# Altium footprint library 7.Connectors&Battary_holders.PcbLib: 133 footprints (part 1 of 9)
Each footprint in its own frame and in the unit in brackets; x right, y up, seen from the top. Pads: shape width x height; smd on the part's side, far side on the other; paste and mask are expansions set on the pad; w line width, h text height; cw(c..) or ccw(c..) is an arc to the next point about the centre after c.
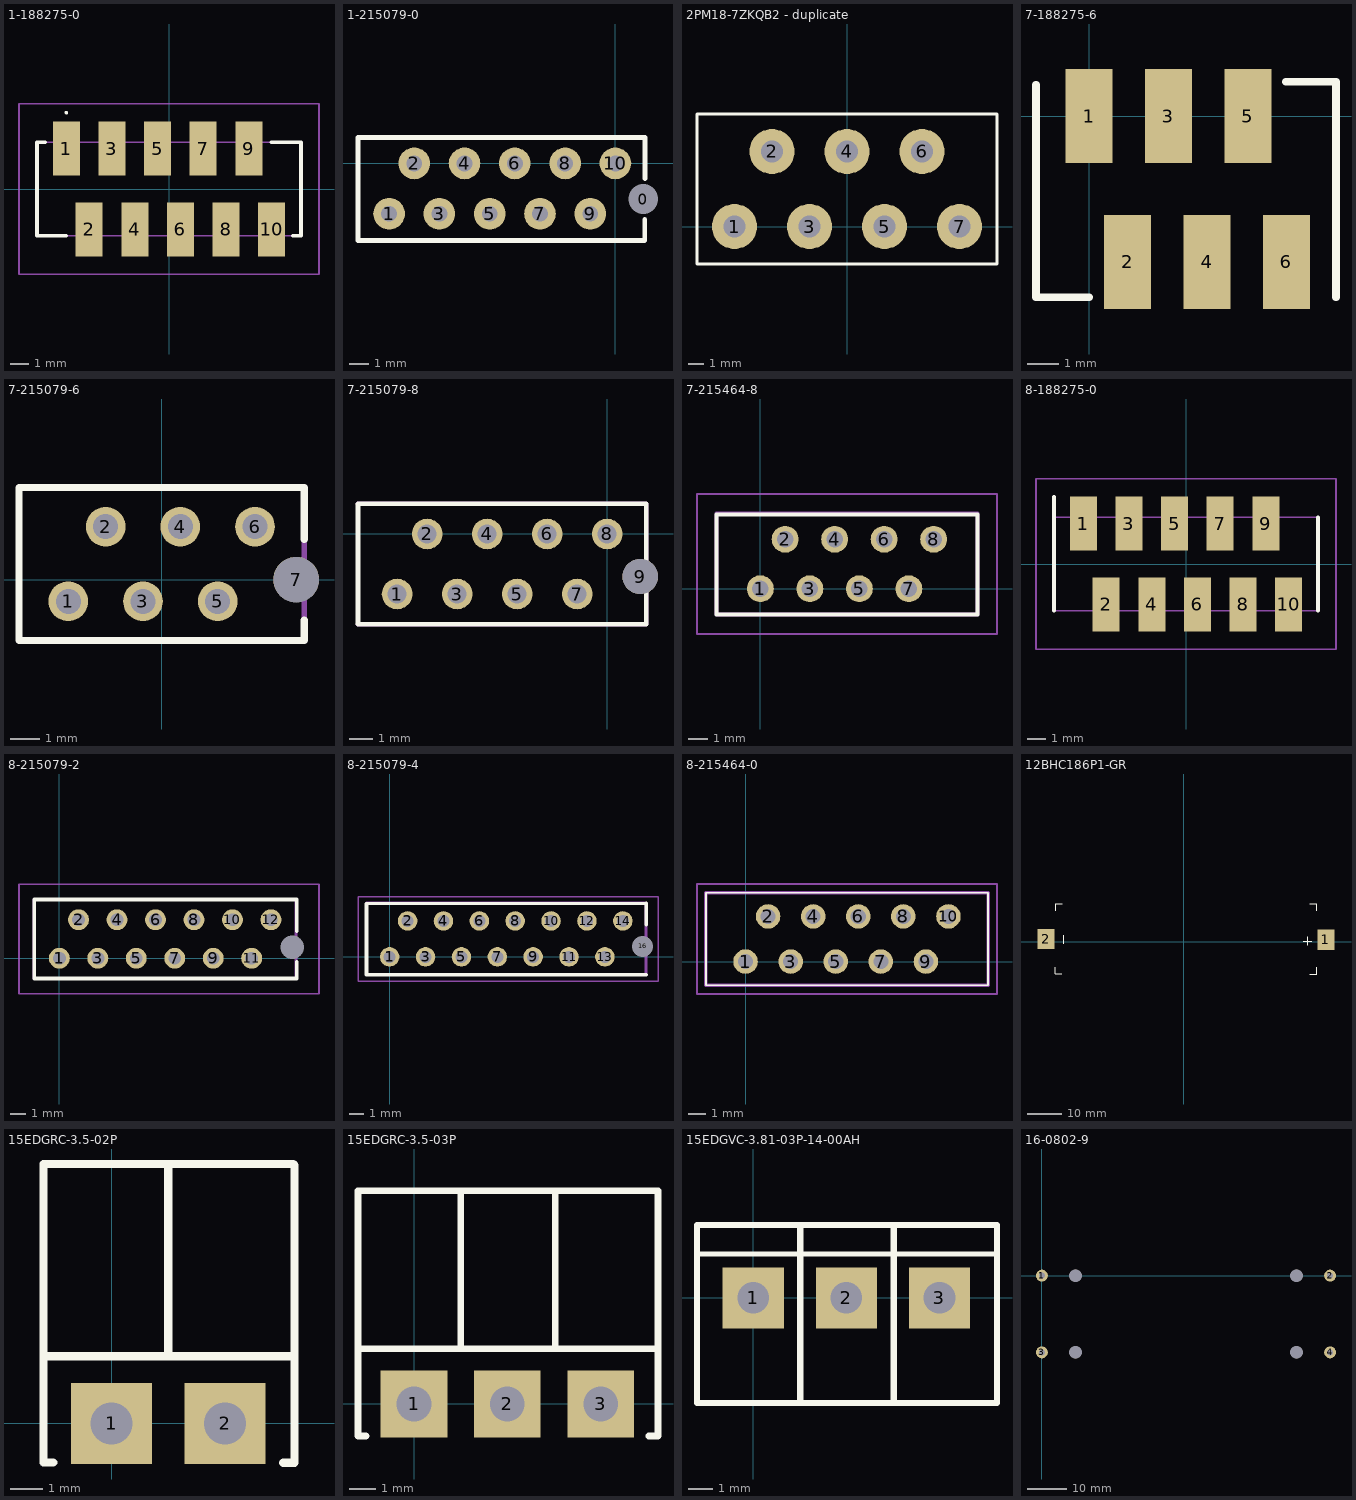
[diagram p0: the footprints below, top view; thin cyan lines are the x and y axes]

## 1-188275-0 [mm]
pads (10):
  rect 1.5x3 smd: 1(-5.715,2.25) 2(-4.445,-2.25) 3(-3.175,2.25) 4(-1.905,-2.25) 5(-0.635,2.25) 6(0.635,-2.25) 7(1.905,2.25) 8(3.175,-2.25) 9(4.445,2.25) 10(5.715,-2.25)
Top Overlay:
  lines w0.1: -5.715,4.2 ccw(c-5.715,4.25) -5.715,4.3 ccw(c-5.715,4.25) -5.715,4.2
  lines w0.2: -6.9,2.6 -7.35,2.6 -7.35,-2.6 -5.715,-2.6 ; 5.7,2.6 7.35,2.6 7.35,-2.6 6.9,-2.6
Mechanical 13:
  lines w0.1: -7.35,-2.6 7.35,-2.6 7.35,2.6 -7.35,2.6 -7.35,-2.6
Mechanical 15:
  lines w0.1: -8.35,-4.75 8.35,-4.75 8.35,4.75 -8.35,4.75 -8.35,-4.75
3D body "1-188275-0.stp": height 5.25, standoff 0, extent -7.315,-3.45 7.315,3.45

## 1-215079-0 [mm]
pads (11):
  round 1 hole 1.5: 0(1.4,-1.8)
  round 1.6 hole 0.8: 1(-11.43,-2.54) 2(-10.16,0) 3(-8.89,-2.54) 4(-7.62,0) 5(-6.35,-2.54) 6(-5.08,0) 7(-3.81,-2.54) 8(-2.54,0) 9(-1.27,-2.54) 10(0,0)
Top Overlay:
  lines w0.25: 1.439,1.309 -13,1.309 -13,-3.891 1.482,-3.891 1.482,-2.818 ; 1.485,-0.761 1.485,1.309
3D body "1-215079-0.stp": height 4, standoff -3.15, extent -13.1,-3.8 1.51,1.2

## 2PM18-7ZKQB2 - duplicate [mm]
pads (7):
  round 3 hole 1.5: 1(-7.5,0) 2(-5,5) 3(-2.5,0) 4(0,5) 5(2.5,0) 6(5,5) 7(7.5,0)
Top Overlay:
  lines w0.2: -10,-2.5 10,-2.5 10,7.5 -10,7.5 -10,-2.5

## 7-188275-6 [mm]
pads (6):
  rect 1.5x3 smd: 1(0,0) 2(1.232,-4.667) 3(2.54,0) 4(3.772,-4.667) 5(5.08,0) 6(6.312,-4.667)
Top Overlay:
  lines w0.25: -1.7,1 -1.7,-5.8 0,-5.8 ; 6.3,1.1 7.9,1.1 7.9,-5.8
3D body "7-188275-6.stp": height 5.3, standoff 0.05, extent -1.639,-5.841 7.911,1.059

## 7-215079-6 [mm]
pads (7):
  round 1.35 hole 0.85: 1(-3.175,-0.74) 2(-1.905,1.8) 3(-0.635,-0.74) 4(0.635,1.8) 5(1.905,-0.74) 6(3.175,1.8)
  round 1.55 hole 1.55: 7(4.575,0)
Top Overlay:
  lines w0.25: 4.85,-1.377 4.85,-2.07 -4.85,-2.07 -4.85,3.13 4.85,3.13 4.85,1.377
Mechanical 13:
  lines w0.2: -4.85,-2.07 4.85,-2.07 4.85,3.13 -4.85,3.13 -4.85,-2.07
3D body "7-215079-6.stp": height 3.96, standoff -3.19, extent -4.78,-1.97 4.78,3.03

## 7-215079-8 [mm] "XS?"
pads (9):
  round 1.3 hole 0.8: 1(-8.89,-2.54) 2(-7.62,0) 3(-6.35,-2.54) 4(-5.08,0) 5(-3.81,-2.54) 6(-2.54,0) 7(-1.27,-2.54) 8(0,0)
  round 1.5 hole 1.5 unplated: 9(1.4,-1.8)
Top Overlay:
  lines w0.2: -10.545,-3.82 1.655,-3.82 1.655,1.28 -10.545,1.28 ; -10.545,-3.82 -10.545,1.28 ; -10.545,-3.82 -10.545,1.28
Mechanical 13:
  lines w0.2: -10.545,-3.82 1.655,-3.82 1.655,1.28 -10.545,1.28
3D body "7-215079-8.stp": height 4.05, standoff -3.1, extent -10.465,-3.77 1.625,1.23

## 7-215464-8 [mm] "XS?"
pads (8):
  round 1.381 hole 0.85: 1(0,0) 2(1.27,2.54) 3(2.54,0) 4(3.81,2.54) 5(5.08,0) 6(6.35,2.54) 7(7.62,0) 8(8.89,2.54)
Top Overlay:
  lines w0.2: -2.255,-1.33 11.145,-1.33 11.145,3.81 -2.255,3.81 -2.255,-1.33
Mechanical 13:
  lines w0.2: -2.255,-1.33 11.145,-1.33 11.145,3.87 -2.255,3.87 -2.255,-1.33
Mechanical 15:
  lines w0.1: -3.255,-2.33 12.145,-2.33 12.145,4.87 -3.255,4.87 -3.255,-2.33
3D body "7-215464-8.stp": height 6.82, standoff -3.18, extent -2.23,-1.23 11.11,3.77

## 8-188275-0 [mm] "XS?"
pads (10):
  rect 1.5x3 smd: 1(-5.715,2.25) 2(-4.445,-2.25) 3(-3.175,2.25) 4(-1.905,-2.25) 5(-0.635,2.25) 6(0.635,-2.25) 7(1.905,2.25) 8(3.175,-2.25) 9(4.445,2.25) 10(5.715,-2.25)
Top Overlay:
  lines w0.2: -7.35,-2.6 -7.35,3.75 ; 7.35,-2.6 7.35,2.6
Mechanical 13:
  lines w0.1: -7.35,-2.6 7.35,-2.6 7.35,2.6 -7.35,2.6 -7.35,-2.6
Mechanical 15:
  lines w0.1: -8.35,-4.75 8.35,-4.75 8.35,4.75 -8.35,4.75 -8.35,-4.75
3D body "8-188275-0.stp": height 5.25, standoff 0, extent -7.315,-3.55 7.315,3.35

## 8-215079-2 [mm]
pads (13):
  round 1.381 hole 0.85: 1(0,0) 2(1.27,2.54) 3(2.54,0) 4(3.81,2.54) 5(5.08,0) 6(6.35,2.54) 7(7.62,0) 8(8.89,2.54) 9(10.16,0) 10(11.43,2.54) 11(12.7,0) 12(13.97,2.54)
  round 0.775 hole 1.55 unplated: MH1(15.37,0.74)
Top Overlay:
  lines w0.25: 15.6,3.87 15.635,3.87 ; 15.677,-0.257 15.677,-1.33 15.37,-1.33 -1.665,-1.33 -1.665,3.87 15.635,3.87 ; 15.68,1.8 15.68,3.87 15.635,3.87
Mechanical 13:
  lines w0.2: -1.665,-1.33 15.635,-1.33 15.635,3.87 -1.665,3.87 -1.665,-1.33
Mechanical 15:
  lines w0.1: -2.665,-2.33 17.145,-2.33 17.145,4.87 -2.665,4.87 -2.665,-2.33
3D body "8-215079-2.stp": height 3.98, standoff -3.17, extent -1.65,-1.23 15.49,3.77

## 8-215079-4 [mm]
pads (15):
  round 1.381 hole 0.85: 1(-0.004,-0.012) 2(1.266,2.528) 3(2.536,-0.012) 4(3.806,2.528) 5(5.076,-0.012) 6(6.346,2.528) 7(7.616,-0.012) 8(8.886,2.528) 9(10.156,-0.012) 10(11.426,2.528) 11(12.696,-0.012) 12(13.966,2.528) 13(15.236,-0.012) 14(16.506,2.528)
  round 0.75 hole 1.5 unplated: 16(17.906,0.728)
Top Overlay:
  lines w0.25: 18.151,-1.282 -1.649,-1.282 -1.649,3.758 18.151,3.798 18.151,2.258
Mechanical 13:
  lines w0.2: -1.649,-1.282 -1.649,3.798 18.151,3.798 18.151,-1.282 -1.649,-1.282
Mechanical 15:
  lines w0.1: -2.25,-1.75 -2.25,4.25 19,4.25 19,-1.75 -2.25,-1.75
3D body "8-215079-4.stp": height 4, standoff -3.15, extent -1.534,-1.212 18.126,3.788

## 8-215464-0 [mm]
pads (10):
  round 1.381 hole 0.85: 1(0,0) 2(1.27,2.54) 3(2.54,0) 4(3.81,2.54) 5(5.08,0) 6(6.35,2.54) 7(7.62,0) 8(8.89,2.54) 9(10.16,0) 10(11.43,2.54)
Top Overlay:
  lines w0.1: -2.235,-1.33 -2.235,3.87 13.665,3.87 13.665,-1.33 -2.235,-1.33
Mechanical 13:
  lines w0.2: -2.235,-1.33 -2.235,3.87 13.665,3.87 13.665,-1.33 -2.235,-1.33
Mechanical 15:
  lines w0.1: -2.735,-1.83 -2.735,4.37 14.165,4.37 14.165,-1.83 -2.735,-1.83
3D body "8-215464-0.stp": height 6.75, standoff -3.25, extent -2.22,-1.23 13.66,3.77

## 12BHC186P1-GR [mm]
pads (2):
  rect 5x6 smd: 1(41.89,0.525) 2(-40.61,0.775)
Top Overlay:
  lines w0.2: -38,-7.5 -38,-9.5 -36,-9.5 ; -37.854,9.142 -37.854,11.142 -35.854,11.142 ; -35.477,-0.536 -35.477,1.964 ; 35.301,0.202 37.801,0.202 ; 36.5,-1 36.5,1.5 ; 37.168,11.13 39.168,11.13 39.168,9.13 ; 37.219,-9.551 39.219,-9.551 39.219,-7.551
3D body "User Library-KEYS1042.STEP": height 14.86, standoff -3.29, extent -37.885,-9.55 39.165,11.1

## 15EDGRC-3.5-02P [mm]
pads (2):
  rect 2.5x2.5 hole 1.3: 1(0,0) 2(3.5,0)
Top Overlay:
  lines w0.254: -2.05,2.075 5.565,2.075 ; -1.8,-1.2 -2.1,-1.2 -2.1,8 5.605,8 5.641,7.964 5.641,-1.211 5.291,-1.211 ; 1.75,2.125 1.75,7.975
  lines w0.256: 3.9,-0.4 4.4,-0.4
3D body "User Library-15EDGRC-3_5-2.step": height 7.2, standoff -3.4, extent -2.09,-1.265 5.71,7.935

## 15EDGRC-3.5-03P [mm]
pads (3):
  rect 2.5x2.5 hole 1.3: 1(0,0) 2(3.5,0) 3(7,0)
Top Overlay:
  lines w0.254: -2.05,2.075 9.1,2.075 ; -1.8,-1.2 -2.1,-1.2 -2.1,8 9.15,8 9.15,-1.2 8.8,-1.2 ; 1.75,2.125 1.75,7.975 ; 5.3,2.075 5.3,7.925
3D body "User Library-15EDGRC-3_5-03P.STEP": height 7.3, standoff -3.3, extent -2.1,-1.2 9.15,8

## 15EDGVC-3.81-03P-14-00AH [mm]
pads (3):
  rect 2.5x2.5 hole 1.3: 1(0,0) 2(3.81,0) 3(7.62,0)
Top Overlay:
  lines w0.2: -2.3,1.8 9.95,1.8
  lines w0.254: 1.925,-4.275 1.925,2.975 ; 5.75,-4.275 5.75,2.975 ; -2.3,-4.3 9.975,-4.3 9.975,2.975 -2.3,2.975 -2.3,-4.3
3D body "15EDGVC-3_81-03P-14-00AH.step": height 9.6, standoff -3, extent -2.3,-4.245 9.92,2.995

## 16-0802-9 [mm]
pads (8):
  round 3 hole 1.5: 1(0,0) 2(72.5,0) 3(0,-19.3) 4(72.5,-19.3)
  round 3 hole 3.2: HOLE(8.45,-19.3) HOLE(8.45,0) HOLE(64.05,-19.3) HOLE(64.05,0)
3D body "Boitier 18650 2 accus.stp": height 24.5, standoff 2.7, extent -2.6,-29.6 75.4,10.4